# Altium footprint library ref-packages.PCBLIB: 1544 footprints (part 103 of 103)
Each footprint in its own frame and in the unit in brackets; x right, y up, seen from the top. Pads: shape width x height; smd on the part's side, far side on the other; paste and mask are expansions set on the pad; w line width, h text height; cw(c..) or ccw(c..) is an arc to the next point about the centre after c.
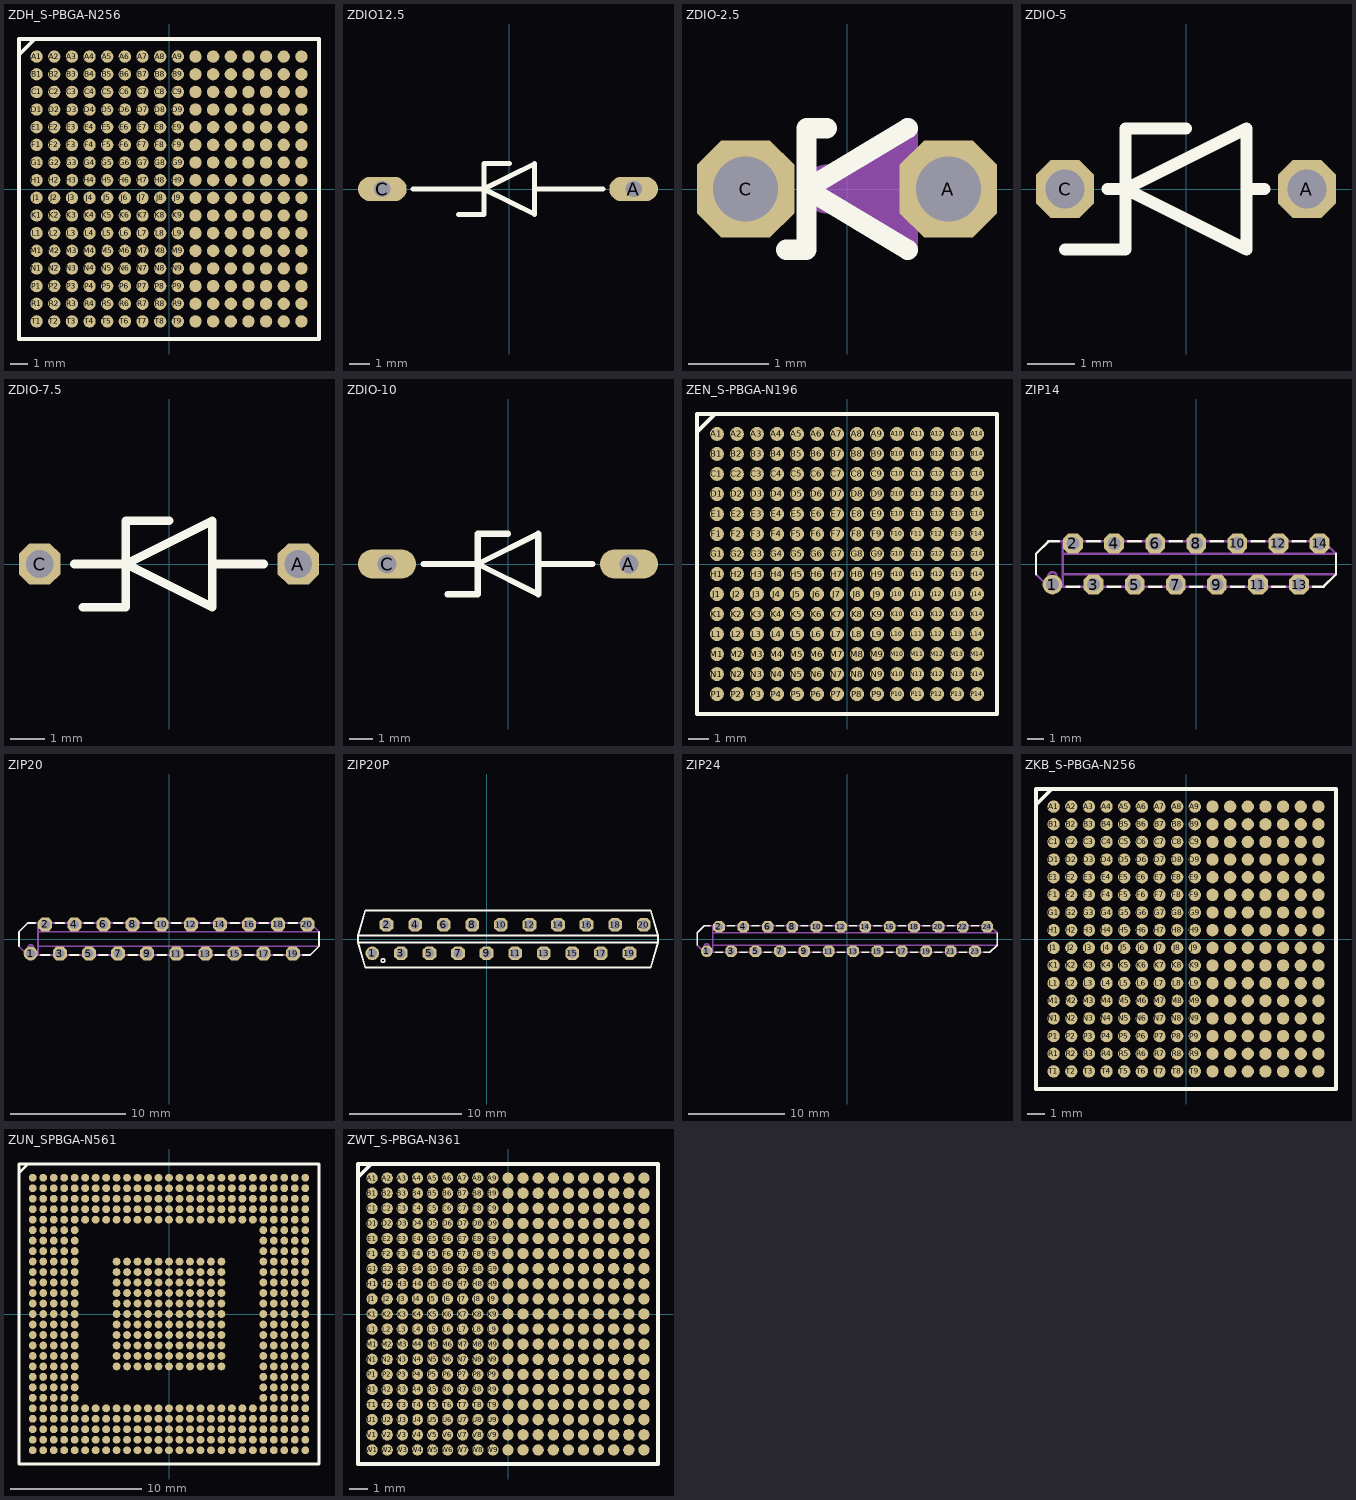
[diagram p102: the footprints below, top view; thin cyan lines are the x and y axes]

## ZDH_S-PBGA-N256 [mil]
pads (256):
  rrect100% 27.56x27.56 smd: A1(-295.28,295.28) A2(-255.91,295.28) A3(-216.54,295.28) A4(-177.17,295.28) A5(-137.8,295.28) A6(-98.43,295.28) A7(-59.06,295.28) A8(-19.69,295.28) A9(19.69,295.28) A10(59.06,295.28) A11(98.43,295.28) A12(137.8,295.28) A13(177.17,295.28) A14(216.54,295.28) A15(255.91,295.28) A16(295.28,295.28) B1(-295.28,255.91) B2(-255.91,255.91) B3(-216.54,255.91) B4(-177.17,255.91) B5(-137.8,255.91) B6(-98.43,255.91) B7(-59.06,255.91) B8(-19.69,255.91) B9(19.69,255.91) B10(59.06,255.91) B11(98.43,255.91) B12(137.8,255.91) B13(177.17,255.91) B14(216.54,255.91) B15(255.91,255.91) B16(295.28,255.91) C1(-295.28,216.54) C2(-255.91,216.54) C3(-216.54,216.54) C4(-177.17,216.54) C5(-137.8,216.54) C6(-98.43,216.54) C7(-59.06,216.54) C8(-19.69,216.54) C9(19.69,216.54) C10(59.06,216.54) C11(98.43,216.54) C12(137.8,216.54) C13(177.17,216.54) C14(216.54,216.54) C15(255.91,216.54) C16(295.28,216.54) D1(-295.28,177.17) D2(-255.91,177.17) D3(-216.54,177.17) D4(-177.17,177.17) D5(-137.8,177.17) D6(-98.43,177.17) D7(-59.06,177.17) D8(-19.69,177.17) D9(19.69,177.17) D10(59.06,177.17) D11(98.43,177.17) D12(137.8,177.17) D13(177.17,177.17) D14(216.54,177.17) D15(255.91,177.17) D16(295.28,177.17) E1(-295.28,137.8) E2(-255.91,137.8) E3(-216.54,137.8) E4(-177.17,137.8) E5(-137.8,137.8) E6(-98.43,137.8) E7(-59.06,137.8) E8(-19.69,137.8) E9(19.69,137.8) E10(59.06,137.8) E11(98.43,137.8) E12(137.8,137.8) E13(177.17,137.8) E14(216.54,137.8) E15(255.91,137.8) E16(295.28,137.8) F1(-295.28,98.43) F2(-255.91,98.43) F3(-216.54,98.43) F4(-177.17,98.43) F5(-137.8,98.43) F6(-98.43,98.43) F7(-59.06,98.43) F8(-19.69,98.43) F9(19.69,98.43) F10(59.06,98.43) F11(98.43,98.43) F12(137.8,98.43) F13(177.17,98.43) F14(216.54,98.43) F15(255.91,98.43) F16(295.28,98.43) G1(-295.28,59.06) G2(-255.91,59.06) G3(-216.54,59.06) G4(-177.17,59.06) G5(-137.8,59.06) G6(-98.43,59.06) G7(-59.06,59.06) G8(-19.69,59.06) G9(19.69,59.06) G10(59.06,59.06) G11(98.43,59.06) G12(137.8,59.06) G13(177.17,59.06) G14(216.54,59.06) G15(255.91,59.06) G16(295.28,59.06) H1(-295.28,19.69) H2(-255.91,19.69) H3(-216.54,19.69) H4(-177.17,19.69) H5(-137.8,19.69) H6(-98.43,19.69) H7(-59.06,19.69) H8(-19.69,19.69) H9(19.69,19.69) H10(59.06,19.69) H11(98.43,19.69) H12(137.8,19.69) H13(177.17,19.69) H14(216.54,19.69) H15(255.91,19.69) H16(295.28,19.69) J1(-295.28,-19.69) J2(-255.91,-19.69) J3(-216.54,-19.69) J4(-177.17,-19.69) J5(-137.8,-19.69) J6(-98.43,-19.69) J7(-59.06,-19.69) J8(-19.69,-19.69) J9(19.69,-19.69) J10(59.06,-19.69) J11(98.43,-19.69) J12(137.8,-19.69) J13(177.17,-19.69) J14(216.54,-19.69) J15(255.91,-19.69) J16(295.28,-19.69) K1(-295.28,-59.06) K2(-255.91,-59.06) K3(-216.54,-59.06) K4(-177.17,-59.06) K5(-137.8,-59.06) K6(-98.43,-59.06) K7(-59.06,-59.06) K8(-19.69,-59.06) K9(19.69,-59.06) K10(59.06,-59.06) K11(98.43,-59.06) K12(137.8,-59.06) K13(177.17,-59.06) K14(216.54,-59.06) K15(255.91,-59.06) K16(295.28,-59.06) L1(-295.28,-98.43) L2(-255.91,-98.43) L3(-216.54,-98.43) L4(-177.17,-98.43) L5(-137.8,-98.43) L6(-98.43,-98.43) L7(-59.06,-98.43) L8(-19.69,-98.43) L9(19.69,-98.43) L10(59.06,-98.43) L11(98.43,-98.43) L12(137.8,-98.43) L13(177.17,-98.43) L14(216.54,-98.43) L15(255.91,-98.43) L16(295.28,-98.43) M1(-295.28,-137.8) M2(-255.91,-137.8) M3(-216.54,-137.8) M4(-177.17,-137.8) M5(-137.8,-137.8) M6(-98.43,-137.8) M7(-59.06,-137.8) M8(-19.69,-137.8) M9(19.69,-137.8) M10(59.06,-137.8) M11(98.43,-137.8) M12(137.8,-137.8) M13(177.17,-137.8) M14(216.54,-137.8) M15(255.91,-137.8) M16(295.28,-137.8) N1(-295.28,-177.17) N2(-255.91,-177.17) N3(-216.54,-177.17) N4(-177.17,-177.17) N5(-137.8,-177.17) N6(-98.43,-177.17) N7(-59.06,-177.17) N8(-19.69,-177.17) N9(19.69,-177.17) N10(59.06,-177.17) N11(98.43,-177.17) N12(137.8,-177.17) N13(177.17,-177.17) N14(216.54,-177.17) N15(255.91,-177.17) N16(295.28,-177.17) P1(-295.28,-216.54) P2(-255.91,-216.54) P3(-216.54,-216.54) P4(-177.17,-216.54) P5(-137.8,-216.54) P6(-98.43,-216.54) P7(-59.06,-216.54) P8(-19.69,-216.54) P9(19.69,-216.54) P10(59.06,-216.54) P11(98.43,-216.54) P12(137.8,-216.54) P13(177.17,-216.54) P14(216.54,-216.54) P15(255.91,-216.54) P16(295.28,-216.54) R1(-295.28,-255.91) R2(-255.91,-255.91) R3(-216.54,-255.91) R4(-177.17,-255.91) R5(-137.8,-255.91) R6(-98.43,-255.91) R7(-59.06,-255.91) R8(-19.69,-255.91) R9(19.69,-255.91) R10(59.06,-255.91) R11(98.43,-255.91) R12(137.8,-255.91) R13(177.17,-255.91) R14(216.54,-255.91) R15(255.91,-255.91) R16(295.28,-255.91) T1(-295.28,-295.28) T2(-255.91,-295.28) T3(-216.54,-295.28) T4(-177.17,-295.28) T5(-137.8,-295.28) T6(-98.43,-295.28) T7(-59.06,-295.28) T8(-19.69,-295.28) T9(19.69,-295.28) T10(59.06,-295.28) T11(98.43,-295.28) T12(137.8,-295.28) T13(177.17,-295.28) T14(216.54,-295.28) T15(255.91,-295.28) T16(295.28,-295.28)
Top Overlay:
  lines w8: -334.58,299.21 -334.58,334.58 -299.21,334.58 ; -334.58,299.21 -334.58,-334.58 334.58,-334.58 334.58,334.58 -299.21,334.58 ; -334.58,299.21 -299.21,334.58
Top Solder:
  drawing of 256 lines, arcs and shapes, not listed

## ZDIO12.5 [mil]
pads (2):
  oval 96x48 hole 32: A(245,0) C(-250,0)
Top Overlay:
  lines w10: -190,0 -50,0 ; -100,-50 -50,-50 -50,0 ; 0,50 -50,50 -50,0 ; 185,0 50,0 ; -50,0 50,50 50,0 ; -50,0 50,-50 50,0

## ZDIO-2.5 [mil]
pads (2):
  oct 48x48 hole 32: A(50,0) C(-50,0)
Top Overlay:
  lines w10: -30,-30 -20,-30 -20,0 ; -10,30 -20,30 -20,0 ; 30,-30 -20,0 ; 30,30 -20,0
Mechanical 16:
  lines w10: 30,-30 30,30
  lines w24: -10,0 20,0 ; 20,-10 20,0 ; 20,10 20,0

## ZDIO-5 [mil]
pads (2):
  oct 48x48 hole 32: A(100,0) C(-100,0)
Top Overlay:
  lines w10: -100,-50 -50,-50 -50,0 ; -65,0 -50,0 ; 0,50 -50,50 -50,0 ; 65,0 50,0 ; -50,0 50,50 50,0 ; -50,0 50,-50 50,0

## ZDIO-7.5 [mil]
pads (2):
  oct 48x48 hole 32: A(150,0) C(-150,0)
Top Overlay:
  lines w10: -110,0 -50,0 ; -100,-50 -50,-50 -50,0 ; 0,50 -50,50 -50,0 ; 110,0 50,0 ; -50,0 50,50 50,0 ; -50,0 50,-50 50,0

## ZDIO-10 [mil]
pads (2):
  oval 96x48 hole 32: A(200,0) C(-200,0)
Top Overlay:
  lines w10: -140,0 -50,0 ; -100,-50 -50,-50 -50,0 ; 0,50 -50,50 -50,0 ; 140,0 50,0 ; -50,0 50,50 50,0 ; -50,0 50,-50 50,0

## ZEN_S-PBGA-N196 [mil]
pads (196):
  rrect100% 27.56x27.56 smd: A1(-255.91,255.91) A2(-216.54,255.91) A3(-177.17,255.91) A4(-137.8,255.91) A5(-98.43,255.91) A6(-59.06,255.91) A7(-19.69,255.91) A8(19.69,255.91) A9(59.06,255.91) A10(98.43,255.91) A11(137.8,255.91) A12(177.17,255.91) A13(216.54,255.91) A14(255.91,255.91) B1(-255.91,216.54) B2(-216.54,216.54) B3(-177.17,216.54) B4(-137.8,216.54) B5(-98.43,216.54) B6(-59.06,216.54) B7(-19.69,216.54) B8(19.69,216.54) B9(59.06,216.54) B10(98.43,216.54) B11(137.8,216.54) B12(177.17,216.54) B13(216.54,216.54) B14(255.91,216.54) C1(-255.91,177.17) C2(-216.54,177.17) C3(-177.17,177.17) C4(-137.8,177.17) C5(-98.43,177.17) C6(-59.06,177.17) C7(-19.69,177.17) C8(19.69,177.17) C9(59.06,177.17) C10(98.43,177.17) C11(137.8,177.17) C12(177.17,177.17) C13(216.54,177.17) C14(255.91,177.17) D1(-255.91,137.8) D2(-216.54,137.8) D3(-177.17,137.8) D4(-137.8,137.8) D5(-98.43,137.8) D6(-59.06,137.8) D7(-19.69,137.8) D8(19.69,137.8) D9(59.06,137.8) D10(98.43,137.8) D11(137.8,137.8) D12(177.17,137.8) D13(216.54,137.8) D14(255.91,137.8) E1(-255.91,98.43) E2(-216.54,98.43) E3(-177.17,98.43) E4(-137.8,98.43) E5(-98.43,98.43) E6(-59.06,98.43) E7(-19.69,98.43) E8(19.69,98.43) E9(59.06,98.43) E10(98.43,98.43) E11(137.8,98.43) E12(177.17,98.43) E13(216.54,98.43) E14(255.91,98.43) F1(-255.91,59.06) F2(-216.54,59.06) F3(-177.17,59.06) F4(-137.8,59.06) F5(-98.43,59.06) F6(-59.06,59.06) F7(-19.69,59.06) F8(19.69,59.06) F9(59.06,59.06) F10(98.43,59.06) F11(137.8,59.06) F12(177.17,59.06) F13(216.54,59.06) F14(255.91,59.06) G1(-255.91,19.69) G2(-216.54,19.69) G3(-177.17,19.69) G4(-137.8,19.69) G5(-98.43,19.69) G6(-59.06,19.69) G7(-19.69,19.69) G8(19.69,19.69) G9(59.06,19.69) G10(98.43,19.69) G11(137.8,19.69) G12(177.17,19.69) G13(216.54,19.69) G14(255.91,19.69) H1(-255.91,-19.69) H2(-216.54,-19.69) H3(-177.17,-19.69) H4(-137.8,-19.69) H5(-98.43,-19.69) H6(-59.06,-19.69) H7(-19.69,-19.69) H8(19.69,-19.69) H9(59.06,-19.69) H10(98.43,-19.69) H11(137.8,-19.69) H12(177.17,-19.69) H13(216.54,-19.69) H14(255.91,-19.69) J1(-255.91,-59.06) J2(-216.54,-59.06) J3(-177.17,-59.06) J4(-137.8,-59.06) J5(-98.43,-59.06) J6(-59.06,-59.06) J7(-19.69,-59.06) J8(19.69,-59.06) J9(59.06,-59.06) J10(98.43,-59.06) J11(137.8,-59.06) J12(177.17,-59.06) J13(216.54,-59.06) J14(255.91,-59.06) K1(-255.91,-98.43) K2(-216.54,-98.43) K3(-177.17,-98.43) K4(-137.8,-98.43) K5(-98.43,-98.43) K6(-59.06,-98.43) K7(-19.69,-98.43) K8(19.69,-98.43) K9(59.06,-98.43) K10(98.43,-98.43) K11(137.8,-98.43) K12(177.17,-98.43) K13(216.54,-98.43) K14(255.91,-98.43) L1(-255.91,-137.8) L2(-216.54,-137.8) L3(-177.17,-137.8) L4(-137.8,-137.8) L5(-98.43,-137.8) L6(-59.06,-137.8) L7(-19.69,-137.8) L8(19.69,-137.8) L9(59.06,-137.8) L10(98.43,-137.8) L11(137.8,-137.8) L12(177.17,-137.8) L13(216.54,-137.8) L14(255.91,-137.8) M1(-255.91,-177.17) M2(-216.54,-177.17) M3(-177.17,-177.17) M4(-137.8,-177.17) M5(-98.43,-177.17) M6(-59.06,-177.17) M7(-19.69,-177.17) M8(19.69,-177.17) M9(59.06,-177.17) M10(98.43,-177.17) M11(137.8,-177.17) M12(177.17,-177.17) M13(216.54,-177.17) M14(255.91,-177.17) N1(-255.91,-216.54) N2(-216.54,-216.54) N3(-177.17,-216.54) N4(-137.8,-216.54) N5(-98.43,-216.54) N6(-59.06,-216.54) N7(-19.69,-216.54) N8(19.69,-216.54) N9(59.06,-216.54) N10(98.43,-216.54) N11(137.8,-216.54) N12(177.17,-216.54) N13(216.54,-216.54) N14(255.91,-216.54) P1(-255.91,-255.91) P2(-216.54,-255.91) P3(-177.17,-255.91) P4(-137.8,-255.91) P5(-98.43,-255.91) P6(-59.06,-255.91) P7(-19.69,-255.91) P8(19.69,-255.91) P9(59.06,-255.91) P10(98.43,-255.91) P11(137.8,-255.91) P12(177.17,-255.91) P13(216.54,-255.91) P14(255.91,-255.91)
Top Overlay:
  lines w8: -295.21,259.84 -295.21,295.21 -259.84,295.21 ; -295.21,259.84 -295.21,-295.21 295.21,-295.21 295.21,295.21 -259.84,295.21 ; -295.21,259.84 -259.84,295.21
Top Solder:
  drawing of 196 lines, arcs and shapes, not listed

## ZIP14 [mil]
pads (14):
  round 48 hole 32: 1(-350,-50)
  oct 48x48 hole 32: 2(-300,50) 3(-250,-50) 4(-200,50) 5(-150,-50) 6(-100,50) 7(-50,-50) 8(0,50) 9(50,-50) 10(100,50) 11(150,-50) 12(200,50) 13(250,-50) 14(300,50)
Top Overlay:
  lines w6: -390,-25 -390,25 -360,55 -335,55 ; -315,-55 -285,-55 ; -265,55 -235,55 ; -215,-55 -185,-55 ; -165,55 -135,55 ; -115,-55 -85,-55 ; -65,55 -35,55 ; -15,-55 15,-55 ; 35,55 65,55 ; 85,-55 115,-55 ; 135,55 165,55 ; 185,-55 215,-55 ; 235,55 265,55 ; 285,-55 310,-55 340,-25 340,25
Mechanical 16:
  circle w6: c-350,-30 r10
  lines w6: -390,-25 -360,-55 -325,-55 ; -335,55 -325,55 ; -315,-55 -325,-55 ; -285,-55 -215,-55 ; -265,55 -325,55 ; -235,55 -165,55 ; -185,-55 -115,-55 ; -135,55 -65,55 ; -85,-55 -15,-55 ; -35,55 35,55 ; 15,-55 85,-55 ; 65,55 135,55 ; 115,-55 185,-55 ; 165,55 235,55 ; 215,-55 285,-55 ; 265,55 310,55 340,25 -325,25 ; 340,-25 -325,-25 ; -325,-55 -325,-25 ; -325,-25 -325,25 ; -325,25 -325,55

## ZIP20 [mil]
pads (20):
  round 48 hole 32: 1(-475,-50)
  oct 48x48 hole 32: 2(-425,50) 3(-375,-50) 4(-325,50) 5(-275,-50) 6(-225,50) 7(-175,-50) 8(-125,50) 9(-75,-50) 10(-25,50) 11(25,-50) 12(75,50) 13(125,-50) 14(175,50) 15(225,-50) 16(275,50) 17(325,-50) 18(375,50) 19(425,-50) 20(475,50)
Top Overlay:
  lines w6: -515,-25 -515,25 -485,55 -460,55 ; -440,-55 -410,-55 ; -390,55 -360,55 ; -340,-55 -310,-55 ; -290,55 -260,55 ; -240,-55 -210,-55 ; -190,55 -160,55 ; -140,-55 -110,-55 ; -90,55 -60,55 ; -40,-55 -10,-55 ; 10,55 40,55 ; 60,-55 90,-55 ; 110,55 140,55 ; 160,-55 190,-55 ; 210,55 240,55 ; 260,-55 290,-55 ; 310,55 340,55 ; 360,-55 390,-55 ; 410,55 440,55 ; 460,-55 485,-55 515,-25 515,25
Mechanical 16:
  circle w6: c-475,-30 r10
  lines w6: -515,-25 -485,-55 -450,-55 ; -460,55 -450,55 ; -440,-55 -450,-55 ; -410,-55 -340,-55 ; -390,55 -450,55 ; -360,55 -290,55 ; -310,-55 -240,-55 ; -260,55 -190,55 ; -210,-55 -140,-55 ; -160,55 -90,55 ; -110,-55 -40,-55 ; -60,55 10,55 ; -10,-55 60,-55 ; 40,55 110,55 ; 90,-55 160,-55 ; 140,55 210,55 ; 190,-55 260,-55 ; 240,55 310,55 ; 290,-55 360,-55 ; 340,55 410,55 ; 390,-55 460,-55 ; 440,55 485,55 515,25 -450,25 ; 515,-25 -450,-25 ; -450,-55 -450,-25 ; -450,-25 -450,25 ; -450,25 -450,55

## ZIP20P [mil]
pads (20):
  round 48 hole 32: 1(-400,-50)
  oct 48x48 hole 32: 2(-350,50) 3(-300,-50) 4(-250,50) 5(-200,-50) 6(-150,50) 7(-100,-50) 8(-50,50) 9(0,-50) 10(50,50) 11(100,-50) 12(150,50) 13(200,-50) 14(250,50) 15(300,-50) 16(350,50) 17(400,-50) 18(450,50) 19(500,-50) 20(550,50)
Top Overlay:
  circle w6: c-362.5,-75 r6.25
  lines w6: 600,0 600,12.5 ; -450,-12.5 -425,-100 575,-100 600,-12.5 ; -450,-12.5 -450,12.5 ; -450,-12.5 600,-12.5 ; -450,12.5 -425,100 575,100 600,12.5 ; -450,12.5 600,12.5 ; 600,-12.5 600,12.5

## ZIP24 [mil]
pads (24):
  round 48 hole 32: 1(-575,-50)
  oct 48x48 hole 32: 2(-525,50) 3(-475,-50) 4(-425,50) 5(-375,-50) 6(-325,50) 7(-275,-50) 8(-225,50) 9(-175,-50) 10(-125,50) 11(-75,-50) 12(-25,50) 13(25,-50) 14(75,50) 15(125,-50) 16(175,50) 17(225,-50) 18(275,50) 19(325,-50) 20(375,50) 21(425,-50) 22(475,50) 23(525,-50) 24(575,50)
Top Overlay:
  lines w6: -615,-25 -615,25 -585,55 -560,55 ; -540,-55 -510,-55 ; -490,55 -460,55 ; -440,-55 -410,-55 ; -390,55 -360,55 ; -340,-55 -310,-55 ; -290,55 -260,55 ; -240,-55 -210,-55 ; -190,55 -160,55 ; -140,-55 -110,-55 ; -90,55 -60,55 ; -40,-55 -10,-55 ; 10,55 40,55 ; 60,-55 90,-55 ; 110,55 140,55 ; 160,-55 190,-55 ; 210,55 240,55 ; 260,-55 290,-55 ; 310,55 340,55 ; 360,-55 390,-55 ; 410,55 440,55 ; 460,-55 490,-55 ; 510,55 540,55 ; 560,-55 585,-55 615,-25 615,25
Mechanical 16:
  circle w6: c-575,-30 r10
  lines w6: -615,-25 -585,-55 -550,-55 ; -560,55 -550,55 ; -540,-55 -550,-55 ; -510,-55 -440,-55 ; -490,55 -550,55 ; -460,55 -390,55 ; -410,-55 -340,-55 ; -360,55 -290,55 ; -310,-55 -240,-55 ; -260,55 -190,55 ; -210,-55 -140,-55 ; -160,55 -90,55 ; -110,-55 -40,-55 ; -60,55 10,55 ; -10,-55 60,-55 ; 40,55 110,55 ; 90,-55 160,-55 ; 140,55 210,55 ; 190,-55 260,-55 ; 240,55 310,55 ; 290,-55 360,-55 ; 340,55 410,55 ; 390,-55 460,-55 ; 440,55 510,55 ; 490,-55 560,-55 ; 540,55 585,55 615,25 -550,25 ; 615,-25 -550,-25 ; -550,-55 -550,-25 ; -550,-25 -550,25 ; -550,25 -550,55

## ZKB_S-PBGA-N256 [mil]
pads (256):
  rrect100% 27.56x27.56 smd: A1(-295.28,295.28) A2(-255.91,295.28) A3(-216.54,295.28) A4(-177.17,295.28) A5(-137.8,295.28) A6(-98.43,295.28) A7(-59.06,295.28) A8(-19.69,295.28) A9(19.69,295.28) A10(59.06,295.28) A11(98.43,295.28) A12(137.8,295.28) A13(177.17,295.28) A14(216.54,295.28) A15(255.91,295.28) A16(295.28,295.28) B1(-295.28,255.91) B2(-255.91,255.91) B3(-216.54,255.91) B4(-177.17,255.91) B5(-137.8,255.91) B6(-98.43,255.91) B7(-59.06,255.91) B8(-19.69,255.91) B9(19.69,255.91) B10(59.06,255.91) B11(98.43,255.91) B12(137.8,255.91) B13(177.17,255.91) B14(216.54,255.91) B15(255.91,255.91) B16(295.28,255.91) C1(-295.28,216.54) C2(-255.91,216.54) C3(-216.54,216.54) C4(-177.17,216.54) C5(-137.8,216.54) C6(-98.43,216.54) C7(-59.06,216.54) C8(-19.69,216.54) C9(19.69,216.54) C10(59.06,216.54) C11(98.43,216.54) C12(137.8,216.54) C13(177.17,216.54) C14(216.54,216.54) C15(255.91,216.54) C16(295.28,216.54) D1(-295.28,177.17) D2(-255.91,177.17) D3(-216.54,177.17) D4(-177.17,177.17) D5(-137.8,177.17) D6(-98.43,177.17) D7(-59.06,177.17) D8(-19.69,177.17) D9(19.69,177.17) D10(59.06,177.17) D11(98.43,177.17) D12(137.8,177.17) D13(177.17,177.17) D14(216.54,177.17) D15(255.91,177.17) D16(295.28,177.17) E1(-295.28,137.8) E2(-255.91,137.8) E3(-216.54,137.8) E4(-177.17,137.8) E5(-137.8,137.8) E6(-98.43,137.8) E7(-59.06,137.8) E8(-19.69,137.8) E9(19.69,137.8) E10(59.06,137.8) E11(98.43,137.8) E12(137.8,137.8) E13(177.17,137.8) E14(216.54,137.8) E15(255.91,137.8) E16(295.28,137.8) F1(-295.28,98.43) F2(-255.91,98.43) F3(-216.54,98.43) F4(-177.17,98.43) F5(-137.8,98.43) F6(-98.43,98.43) F7(-59.06,98.43) F8(-19.69,98.43) F9(19.69,98.43) F10(59.06,98.43) F11(98.43,98.43) F12(137.8,98.43) F13(177.17,98.43) F14(216.54,98.43) F15(255.91,98.43) F16(295.28,98.43) G1(-295.28,59.06) G2(-255.91,59.06) G3(-216.54,59.06) G4(-177.17,59.06) G5(-137.8,59.06) G6(-98.43,59.06) G7(-59.06,59.06) G8(-19.69,59.06) G9(19.69,59.06) G10(59.06,59.06) G11(98.43,59.06) G12(137.8,59.06) G13(177.17,59.06) G14(216.54,59.06) G15(255.91,59.06) G16(295.28,59.06) H1(-295.28,19.69) H2(-255.91,19.69) H3(-216.54,19.69) H4(-177.17,19.69) H5(-137.8,19.69) H6(-98.43,19.69) H7(-59.06,19.69) H8(-19.69,19.69) H9(19.69,19.69) H10(59.06,19.69) H11(98.43,19.69) H12(137.8,19.69) H13(177.17,19.69) H14(216.54,19.69) H15(255.91,19.69) H16(295.28,19.69) J1(-295.28,-19.69) J2(-255.91,-19.69) J3(-216.54,-19.69) J4(-177.17,-19.69) J5(-137.8,-19.69) J6(-98.43,-19.69) J7(-59.06,-19.69) J8(-19.69,-19.69) J9(19.69,-19.69) J10(59.06,-19.69) J11(98.43,-19.69) J12(137.8,-19.69) J13(177.17,-19.69) J14(216.54,-19.69) J15(255.91,-19.69) J16(295.28,-19.69) K1(-295.28,-59.06) K2(-255.91,-59.06) K3(-216.54,-59.06) K4(-177.17,-59.06) K5(-137.8,-59.06) K6(-98.43,-59.06) K7(-59.06,-59.06) K8(-19.69,-59.06) K9(19.69,-59.06) K10(59.06,-59.06) K11(98.43,-59.06) K12(137.8,-59.06) K13(177.17,-59.06) K14(216.54,-59.06) K15(255.91,-59.06) K16(295.28,-59.06) L1(-295.28,-98.43) L2(-255.91,-98.43) L3(-216.54,-98.43) L4(-177.17,-98.43) L5(-137.8,-98.43) L6(-98.43,-98.43) L7(-59.06,-98.43) L8(-19.69,-98.43) L9(19.69,-98.43) L10(59.06,-98.43) L11(98.43,-98.43) L12(137.8,-98.43) L13(177.17,-98.43) L14(216.54,-98.43) L15(255.91,-98.43) L16(295.28,-98.43) M1(-295.28,-137.8) M2(-255.91,-137.8) M3(-216.54,-137.8) M4(-177.17,-137.8) M5(-137.8,-137.8) M6(-98.43,-137.8) M7(-59.06,-137.8) M8(-19.69,-137.8) M9(19.69,-137.8) M10(59.06,-137.8) M11(98.43,-137.8) M12(137.8,-137.8) M13(177.17,-137.8) M14(216.54,-137.8) M15(255.91,-137.8) M16(295.28,-137.8) N1(-295.28,-177.17) N2(-255.91,-177.17) N3(-216.54,-177.17) N4(-177.17,-177.17) N5(-137.8,-177.17) N6(-98.43,-177.17) N7(-59.06,-177.17) N8(-19.69,-177.17) N9(19.69,-177.17) N10(59.06,-177.17) N11(98.43,-177.17) N12(137.8,-177.17) N13(177.17,-177.17) N14(216.54,-177.17) N15(255.91,-177.17) N16(295.28,-177.17) P1(-295.28,-216.54) P2(-255.91,-216.54) P3(-216.54,-216.54) P4(-177.17,-216.54) P5(-137.8,-216.54) P6(-98.43,-216.54) P7(-59.06,-216.54) P8(-19.69,-216.54) P9(19.69,-216.54) P10(59.06,-216.54) P11(98.43,-216.54) P12(137.8,-216.54) P13(177.17,-216.54) P14(216.54,-216.54) P15(255.91,-216.54) P16(295.28,-216.54) R1(-295.28,-255.91) R2(-255.91,-255.91) R3(-216.54,-255.91) R4(-177.17,-255.91) R5(-137.8,-255.91) R6(-98.43,-255.91) R7(-59.06,-255.91) R8(-19.69,-255.91) R9(19.69,-255.91) R10(59.06,-255.91) R11(98.43,-255.91) R12(137.8,-255.91) R13(177.17,-255.91) R14(216.54,-255.91) R15(255.91,-255.91) R16(295.28,-255.91) T1(-295.28,-295.28) T2(-255.91,-295.28) T3(-216.54,-295.28) T4(-177.17,-295.28) T5(-137.8,-295.28) T6(-98.43,-295.28) T7(-59.06,-295.28) T8(-19.69,-295.28) T9(19.69,-295.28) T10(59.06,-295.28) T11(98.43,-295.28) T12(137.8,-295.28) T13(177.17,-295.28) T14(216.54,-295.28) T15(255.91,-295.28) T16(295.28,-295.28)
Top Overlay:
  lines w8: -334.58,299.21 -334.58,334.58 -299.21,334.58 ; -334.58,299.21 -334.58,-334.58 334.58,-334.58 334.58,334.58 -299.21,334.58 ; -334.58,299.21 -299.21,334.58
Top Solder:
  drawing of 256 lines, arcs and shapes, not listed

## ZUN_SPBGA-N561 [mm]
pads (561):
  rrect100% 0.6x0.6 smd: A1(-10.4,10.4) A2(-9.6,10.4) A3(-8.8,10.4) A4(-8,10.4) A5(-7.2,10.4) A6(-6.4,10.4) A7(-5.6,10.4) A8(-4.8,10.4) A9(-4,10.4) A10(-3.2,10.4) A11(-2.4,10.4) A12(-1.6,10.4) A13(-0.8,10.4) A14(0,10.4) A15(0.8,10.4) A16(1.6,10.4) A17(2.4,10.4) A18(3.2,10.4) A19(4,10.4) A20(4.8,10.4) A21(5.6,10.4) A22(6.4,10.4) A23(7.2,10.4) A24(8,10.4) A25(8.8,10.4) A26(9.6,10.4) A27(10.4,10.4) AA1(-10.4,-5.6) AA2(-9.6,-5.6) AA3(-8.8,-5.6) AA4(-8,-5.6) AA5(-7.2,-5.6) AA23(7.2,-5.6) AA24(8,-5.6) AA25(8.8,-5.6) AA26(9.6,-5.6) AA27(10.4,-5.6) AB1(-10.4,-6.4) AB2(-9.6,-6.4) AB3(-8.8,-6.4) AB4(-8,-6.4) AB5(-7.2,-6.4) AB23(7.2,-6.4) AB24(8,-6.4) AB25(8.8,-6.4) AB26(9.6,-6.4) AB27(10.4,-6.4) AC1(-10.4,-7.2) AC2(-9.6,-7.2) AC3(-8.8,-7.2) AC4(-8,-7.2) AC5(-7.2,-7.2) AC6(-6.4,-7.2) AC7(-5.6,-7.2) AC8(-4.8,-7.2) AC9(-4,-7.2) AC10(-3.2,-7.2) AC11(-2.4,-7.2) AC12(-1.6,-7.2) AC13(-0.8,-7.2) AC14(0,-7.2) AC15(0.8,-7.2) AC16(1.6,-7.2) AC17(2.4,-7.2) AC18(3.2,-7.2) AC19(4,-7.2) AC20(4.8,-7.2) AC21(5.6,-7.2) AC22(6.4,-7.2) AC23(7.2,-7.2) AC24(8,-7.2) AC25(8.8,-7.2) AC26(9.6,-7.2) AC27(10.4,-7.2) AD1(-10.4,-8) AD2(-9.6,-8) AD3(-8.8,-8) AD4(-8,-8) AD5(-7.2,-8) AD6(-6.4,-8) AD7(-5.6,-8) AD8(-4.8,-8) AD9(-4,-8) AD10(-3.2,-8) AD11(-2.4,-8) AD12(-1.6,-8) AD13(-0.8,-8) AD14(0,-8) AD15(0.8,-8) AD16(1.6,-8) AD17(2.4,-8) AD18(3.2,-8) AD19(4,-8) AD20(4.8,-8) AD21(5.6,-8) AD22(6.4,-8) AD23(7.2,-8) AD24(8,-8) AD25(8.8,-8) AD26(9.6,-8) AD27(10.4,-8) AE1(-10.4,-8.8) AE2(-9.6,-8.8) AE3(-8.8,-8.8) AE4(-8,-8.8) AE5(-7.2,-8.8) AE6(-6.4,-8.8) AE7(-5.6,-8.8) AE8(-4.8,-8.8) AE9(-4,-8.8) AE10(-3.2,-8.8) AE11(-2.4,-8.8) AE12(-1.6,-8.8) AE13(-0.8,-8.8) AE14(0,-8.8) AE15(0.8,-8.8) AE16(1.6,-8.8) AE17(2.4,-8.8) AE18(3.2,-8.8) AE19(4,-8.8) AE20(4.8,-8.8) AE21(5.6,-8.8) AE22(6.4,-8.8) AE23(7.2,-8.8) AE24(8,-8.8) AE25(8.8,-8.8) AE26(9.6,-8.8) AE27(10.4,-8.8) AF1(-10.4,-9.6) AF2(-9.6,-9.6) AF3(-8.8,-9.6) AF4(-8,-9.6) AF5(-7.2,-9.6) AF6(-6.4,-9.6) AF7(-5.6,-9.6) AF8(-4.8,-9.6) AF9(-4,-9.6) AF10(-3.2,-9.6) AF11(-2.4,-9.6) AF12(-1.6,-9.6) AF13(-0.8,-9.6) AF14(0,-9.6) AF15(0.8,-9.6) AF16(1.6,-9.6) AF17(2.4,-9.6) AF18(3.2,-9.6) AF19(4,-9.6) AF20(4.8,-9.6) AF21(5.6,-9.6) AF22(6.4,-9.6) AF23(7.2,-9.6) AF24(8,-9.6) AF25(8.8,-9.6) AF26(9.6,-9.6) AF27(10.4,-9.6) AG1(-10.4,-10.4) AG2(-9.6,-10.4) AG3(-8.8,-10.4) AG4(-8,-10.4) AG5(-7.2,-10.4) AG6(-6.4,-10.4) AG7(-5.6,-10.4) AG8(-4.8,-10.4) AG9(-4,-10.4) AG10(-3.2,-10.4) AG11(-2.4,-10.4) AG12(-1.6,-10.4) AG13(-0.8,-10.4) AG14(0,-10.4) AG15(0.8,-10.4) AG16(1.6,-10.4) AG17(2.4,-10.4) AG18(3.2,-10.4) AG19(4,-10.4) AG20(4.8,-10.4) AG21(5.6,-10.4) AG22(6.4,-10.4) AG23(7.2,-10.4) AG24(8,-10.4) AG25(8.8,-10.4) AG26(9.6,-10.4) AG27(10.4,-10.4) B1(-10.4,9.6) B2(-9.6,9.6) B3(-8.8,9.6) B4(-8,9.6) B5(-7.2,9.6) B6(-6.4,9.6) B7(-5.6,9.6) B8(-4.8,9.6) B9(-4,9.6) B10(-3.2,9.6) B11(-2.4,9.6) B12(-1.6,9.6) B13(-0.8,9.6) B14(0,9.6) B15(0.8,9.6) B16(1.6,9.6) B17(2.4,9.6) B18(3.2,9.6) B19(4,9.6) B20(4.8,9.6) B21(5.6,9.6) B22(6.4,9.6) B23(7.2,9.6) B24(8,9.6) B25(8.8,9.6) B26(9.6,9.6) B27(10.4,9.6) C1(-10.4,8.8) C2(-9.6,8.8) C3(-8.8,8.8) C4(-8,8.8) C5(-7.2,8.8) C6(-6.4,8.8) C7(-5.6,8.8) C8(-4.8,8.8) C9(-4,8.8) C10(-3.2,8.8) C11(-2.4,8.8) C12(-1.6,8.8) C13(-0.8,8.8) C14(0,8.8) C15(0.8,8.8) C16(1.6,8.8) C17(2.4,8.8) C18(3.2,8.8) C19(4,8.8) C20(4.8,8.8) C21(5.6,8.8) C22(6.4,8.8) C23(7.2,8.8) C24(8,8.8) C25(8.8,8.8) C26(9.6,8.8) C27(10.4,8.8) D1(-10.4,8) D2(-9.6,8) D3(-8.8,8) D4(-8,8) D5(-7.2,8) D6(-6.4,8) D7(-5.6,8) D8(-4.8,8) D9(-4,8) D10(-3.2,8) D11(-2.4,8) D12(-1.6,8) D13(-0.8,8) D14(0,8) D15(0.8,8) D16(1.6,8) D17(2.4,8) D18(3.2,8) D19(4,8) D20(4.8,8) D21(5.6,8) D22(6.4,8) D23(7.2,8) D24(8,8) D25(8.8,8) D26(9.6,8) D27(10.4,8) E1(-10.4,7.2) E2(-9.6,7.2) E3(-8.8,7.2) E4(-8,7.2) E5(-7.2,7.2) E6(-6.4,7.2) E7(-5.6,7.2) E8(-4.8,7.2) E9(-4,7.2) E10(-3.2,7.2) E11(-2.4,7.2) E12(-1.6,7.2) E13(-0.8,7.2) E14(0,7.2) E15(0.8,7.2) E16(1.6,7.2) E17(2.4,7.2) E18(3.2,7.2) E19(4,7.2) E20(4.8,7.2) E21(5.6,7.2) E22(6.4,7.2) E23(7.2,7.2) E24(8,7.2) E25(8.8,7.2) E26(9.6,7.2) E27(10.4,7.2) F1(-10.4,6.4) F2(-9.6,6.4) F3(-8.8,6.4) F4(-8,6.4) F5(-7.2,6.4) F23(7.2,6.4) F24(8,6.4) F25(8.8,6.4) F26(9.6,6.4) F27(10.4,6.4) G1(-10.4,5.6) G2(-9.6,5.6) G3(-8.8,5.6) G4(-8,5.6) G5(-7.2,5.6) G23(7.2,5.6) G24(8,5.6) G25(8.8,5.6) G26(9.6,5.6) G27(10.4,5.6) H1(-10.4,4.8) H2(-9.6,4.8) H3(-8.8,4.8) H4(-8,4.8) H5(-7.2,4.8) H23(7.2,4.8) H24(8,4.8) H25(8.8,4.8) H26(9.6,4.8) H27(10.4,4.8) J1(-10.4,4) J2(-9.6,4) J3(-8.8,4) J4(-8,4) J5(-7.2,4) J9(-4,4) J10(-3.2,4) J11(-2.4,4) J12(-1.6,4) J13(-0.8,4) J14(0,4) J15(0.8,4) J16(1.6,4) J17(2.4,4) J18(3.2,4) J19(4,4) J23(7.2,4) J24(8,4) J25(8.8,4) J26(9.6,4) J27(10.4,4) K1(-10.4,3.2) K2(-9.6,3.2) K3(-8.8,3.2) K4(-8,3.2) K5(-7.2,3.2) K9(-4,3.2) K10(-3.2,3.2) K11(-2.4,3.2) K12(-1.6,3.2) K13(-0.8,3.2) K14(0,3.2) K15(0.8,3.2) K16(1.6,3.2) K17(2.4,3.2) K18(3.2,3.2) K19(4,3.2) K23(7.2,3.2) K24(8,3.2) K25(8.8,3.2) K26(9.6,3.2) K27(10.4,3.2) L1(-10.4,2.4) L2(-9.6,2.4) L3(-8.8,2.4) L4(-8,2.4) L5(-7.2,2.4) L9(-4,2.4) L10(-3.2,2.4) L11(-2.4,2.4) L12(-1.6,2.4) L13(-0.8,2.4) L14(0,2.4) L15(0.8,2.4) L16(1.6,2.4) L17(2.4,2.4) L18(3.2,2.4) L19(4,2.4) L23(7.2,2.4) L24(8,2.4) L25(8.8,2.4) L26(9.6,2.4) L27(10.4,2.4) M1(-10.4,1.6) M2(-9.6,1.6) M3(-8.8,1.6) M4(-8,1.6) M5(-7.2,1.6) M9(-4,1.6) M10(-3.2,1.6) M11(-2.4,1.6) M12(-1.6,1.6) M13(-0.8,1.6) M14(0,1.6) M15(0.8,1.6) M16(1.6,1.6) M17(2.4,1.6) M18(3.2,1.6) M19(4,1.6) M23(7.2,1.6) M24(8,1.6) M25(8.8,1.6) M26(9.6,1.6) M27(10.4,1.6) N1(-10.4,0.8) N2(-9.6,0.8) N3(-8.8,0.8) N4(-8,0.8) N5(-7.2,0.8) N9(-4,0.8) N10(-3.2,0.8) N11(-2.4,0.8) N12(-1.6,0.8) N13(-0.8,0.8) N14(0,0.8) N15(0.8,0.8) N16(1.6,0.8) N17(2.4,0.8) N18(3.2,0.8) N19(4,0.8) N23(7.2,0.8) N24(8,0.8) N25(8.8,0.8) N26(9.6,0.8) N27(10.4,0.8) P1(-10.4,0) P2(-9.6,0) P3(-8.8,0) P4(-8,0) P5(-7.2,0) P9(-4,0) P10(-3.2,0) P11(-2.4,0) P12(-1.6,0) P13(-0.8,0) P14(0,0) P15(0.8,0) P16(1.6,0) P17(2.4,0) P18(3.2,0) P19(4,0) P23(7.2,0) P24(8,0) P25(8.8,0) P26(9.6,0) P27(10.4,0) R1(-10.4,-0.8) R2(-9.6,-0.8) R3(-8.8,-0.8) R4(-8,-0.8) R5(-7.2,-0.8) R9(-4,-0.8) R10(-3.2,-0.8) R11(-2.4,-0.8) R12(-1.6,-0.8) R13(-0.8,-0.8) R14(0,-0.8) R15(0.8,-0.8) R16(1.6,-0.8) R17(2.4,-0.8) R18(3.2,-0.8) R19(4,-0.8) R23(7.2,-0.8) R24(8,-0.8) R25(8.8,-0.8) R26(9.6,-0.8) R27(10.4,-0.8) T1(-10.4,-1.6) T2(-9.6,-1.6) T3(-8.8,-1.6) T4(-8,-1.6) T5(-7.2,-1.6) T9(-4,-1.6) T10(-3.2,-1.6) T11(-2.4,-1.6) T12(-1.6,-1.6) T13(-0.8,-1.6) T14(0,-1.6) T15(0.8,-1.6) T16(1.6,-1.6) T17(2.4,-1.6) T18(3.2,-1.6) T19(4,-1.6) T23(7.2,-1.6) T24(8,-1.6) T25(8.8,-1.6) T26(9.6,-1.6) T27(10.4,-1.6) U1(-10.4,-2.4) U2(-9.6,-2.4) U3(-8.8,-2.4) U4(-8,-2.4) U5(-7.2,-2.4) U9(-4,-2.4) U10(-3.2,-2.4) U11(-2.4,-2.4) U12(-1.6,-2.4) U13(-0.8,-2.4) U14(0,-2.4) U15(0.8,-2.4) U16(1.6,-2.4) U17(2.4,-2.4) U18(3.2,-2.4) U19(4,-2.4) U23(7.2,-2.4) U24(8,-2.4) U25(8.8,-2.4) U26(9.6,-2.4) U27(10.4,-2.4) V1(-10.4,-3.2) V2(-9.6,-3.2) V3(-8.8,-3.2) V4(-8,-3.2) V5(-7.2,-3.2) V9(-4,-3.2) V10(-3.2,-3.2) V11(-2.4,-3.2) V12(-1.6,-3.2) V13(-0.8,-3.2) V14(0,-3.2) V15(0.8,-3.2) V16(1.6,-3.2) V17(2.4,-3.2) V18(3.2,-3.2) V19(4,-3.2) V23(7.2,-3.2) V24(8,-3.2) V25(8.8,-3.2) V26(9.6,-3.2) V27(10.4,-3.2) W1(-10.4,-4) W2(-9.6,-4) W3(-8.8,-4) W4(-8,-4) W5(-7.2,-4) W9(-4,-4) W10(-3.2,-4) W11(-2.4,-4) W12(-1.6,-4) W13(-0.8,-4) W14(0,-4) W15(0.8,-4) W16(1.6,-4) W17(2.4,-4) W18(3.2,-4) W19(4,-4) W23(7.2,-4) W24(8,-4) W25(8.8,-4) W26(9.6,-4) W27(10.4,-4) Y1(-10.4,-4.8) Y2(-9.6,-4.8) Y3(-8.8,-4.8) Y4(-8,-4.8) Y5(-7.2,-4.8) Y23(7.2,-4.8) Y24(8,-4.8) Y25(8.8,-4.8) Y26(9.6,-4.8) Y27(10.4,-4.8)
Top Overlay:
  lines w0.203: -11.448,10.75 -11.448,11.448 -10.75,11.448 ; -11.448,10.75 -11.448,-11.448 11.448,-11.448 11.448,11.448 -10.75,11.448 ; -11.448,10.75 -10.75,11.448
Top Solder:
  drawing of 561 lines, arcs and shapes, not listed

## ZWT_S-PBGA-N361 [mil]
pads (361):
  rrect100% 23.62x23.62 smd: A1(-283.46,283.46) A2(-251.97,283.46) A3(-220.47,283.46) A4(-188.98,283.46) A5(-157.48,283.46) A6(-125.98,283.46) A7(-94.49,283.46) A8(-62.99,283.46) A9(-31.5,283.46) A10(0,283.46) A11(31.5,283.46) A12(62.99,283.46) A13(94.49,283.46) A14(125.98,283.46) A15(157.48,283.46) A16(188.98,283.46) A17(220.47,283.46) A18(251.97,283.46) A19(283.46,283.46) B1(-283.46,251.97) B2(-251.97,251.97) B3(-220.47,251.97) B4(-188.98,251.97) B5(-157.48,251.97) B6(-125.98,251.97) B7(-94.49,251.97) B8(-62.99,251.97) B9(-31.5,251.97) B10(0,251.97) B11(31.5,251.97) B12(62.99,251.97) B13(94.49,251.97) B14(125.98,251.97) B15(157.48,251.97) B16(188.98,251.97) B17(220.47,251.97) B18(251.97,251.97) B19(283.46,251.97) C1(-283.46,220.47) C2(-251.97,220.47) C3(-220.47,220.47) C4(-188.98,220.47) C5(-157.48,220.47) C6(-125.98,220.47) C7(-94.49,220.47) C8(-62.99,220.47) C9(-31.5,220.47) C10(0,220.47) C11(31.5,220.47) C12(62.99,220.47) C13(94.49,220.47) C14(125.98,220.47) C15(157.48,220.47) C16(188.98,220.47) C17(220.47,220.47) C18(251.97,220.47) C19(283.46,220.47) D1(-283.46,188.98) D2(-251.97,188.98) D3(-220.47,188.98) D4(-188.98,188.98) D5(-157.48,188.98) D6(-125.98,188.98) D7(-94.49,188.98) D8(-62.99,188.98) D9(-31.5,188.98) D10(0,188.98) D11(31.5,188.98) D12(62.99,188.98) D13(94.49,188.98) D14(125.98,188.98) D15(157.48,188.98) D16(188.98,188.98) D17(220.47,188.98) D18(251.97,188.98) D19(283.46,188.98) E1(-283.46,157.48) E2(-251.97,157.48) E3(-220.47,157.48) E4(-188.98,157.48) E5(-157.48,157.48) E6(-125.98,157.48) E7(-94.49,157.48) E8(-62.99,157.48) E9(-31.5,157.48) E10(0,157.48) E11(31.5,157.48) E12(62.99,157.48) E13(94.49,157.48) E14(125.98,157.48) E15(157.48,157.48) E16(188.98,157.48) E17(220.47,157.48) E18(251.97,157.48) E19(283.46,157.48) F1(-283.46,125.98) F2(-251.97,125.98) F3(-220.47,125.98) F4(-188.98,125.98) F5(-157.48,125.98) F6(-125.98,125.98) F7(-94.49,125.98) F8(-62.99,125.98) F9(-31.5,125.98) F10(0,125.98) F11(31.5,125.98) F12(62.99,125.98) F13(94.49,125.98) F14(125.98,125.98) F15(157.48,125.98) F16(188.98,125.98) F17(220.47,125.98) F18(251.97,125.98) F19(283.46,125.98) G1(-283.46,94.49) G2(-251.97,94.49) G3(-220.47,94.49) G4(-188.98,94.49) G5(-157.48,94.49) G6(-125.98,94.49) G7(-94.49,94.49) G8(-62.99,94.49) G9(-31.5,94.49) G10(0,94.49) G11(31.5,94.49) G12(62.99,94.49) G13(94.49,94.49) G14(125.98,94.49) G15(157.48,94.49) G16(188.98,94.49) G17(220.47,94.49) G18(251.97,94.49) G19(283.46,94.49) H1(-283.46,62.99) H2(-251.97,62.99) H3(-220.47,62.99) H4(-188.98,62.99) H5(-157.48,62.99) H6(-125.98,62.99) H7(-94.49,62.99) H8(-62.99,62.99) H9(-31.5,62.99) H10(0,62.99) H11(31.5,62.99) H12(62.99,62.99) H13(94.49,62.99) H14(125.98,62.99) H15(157.48,62.99) H16(188.98,62.99) H17(220.47,62.99) H18(251.97,62.99) H19(283.46,62.99) J1(-283.46,31.5) J2(-251.97,31.5) J3(-220.47,31.5) J4(-188.98,31.5) J5(-157.48,31.5) J6(-125.98,31.5) J7(-94.49,31.5) J8(-62.99,31.5) J9(-31.5,31.5) J10(0,31.5) J11(31.5,31.5) J12(62.99,31.5) J13(94.49,31.5) J14(125.98,31.5) J15(157.48,31.5) J16(188.98,31.5) J17(220.47,31.5) J18(251.97,31.5) J19(283.46,31.5) K1(-283.46,0) K2(-251.97,0) K3(-220.47,0) K4(-188.98,0) K5(-157.48,0) K6(-125.98,0) K7(-94.49,0) K8(-62.99,0) K9(-31.5,0) K10(0,0) K11(31.5,0) K12(62.99,0) K13(94.49,0) K14(125.98,0) K15(157.48,0) K16(188.98,0) K17(220.47,0) K18(251.97,0) K19(283.46,0) L1(-283.46,-31.5) L2(-251.97,-31.5) L3(-220.47,-31.5) L4(-188.98,-31.5) L5(-157.48,-31.5) L6(-125.98,-31.5) L7(-94.49,-31.5) L8(-62.99,-31.5) L9(-31.5,-31.5) L10(0,-31.5) L11(31.5,-31.5) L12(62.99,-31.5) L13(94.49,-31.5) L14(125.98,-31.5) L15(157.48,-31.5) L16(188.98,-31.5) L17(220.47,-31.5) L18(251.97,-31.5) L19(283.46,-31.5) M1(-283.46,-62.99) M2(-251.97,-62.99) M3(-220.47,-62.99) M4(-188.98,-62.99) M5(-157.48,-62.99) M6(-125.98,-62.99) M7(-94.49,-62.99) M8(-62.99,-62.99) M9(-31.5,-62.99) M10(0,-62.99) M11(31.5,-62.99) M12(62.99,-62.99) M13(94.49,-62.99) M14(125.98,-62.99) M15(157.48,-62.99) M16(188.98,-62.99) M17(220.47,-62.99) M18(251.97,-62.99) M19(283.46,-62.99) N1(-283.46,-94.49) N2(-251.97,-94.49) N3(-220.47,-94.49) N4(-188.98,-94.49) N5(-157.48,-94.49) N6(-125.98,-94.49) N7(-94.49,-94.49) N8(-62.99,-94.49) N9(-31.5,-94.49) N10(0,-94.49) N11(31.5,-94.49) N12(62.99,-94.49) N13(94.49,-94.49) N14(125.98,-94.49) N15(157.48,-94.49) N16(188.98,-94.49) N17(220.47,-94.49) N18(251.97,-94.49) N19(283.46,-94.49) P1(-283.46,-125.98) P2(-251.97,-125.98) P3(-220.47,-125.98) P4(-188.98,-125.98) P5(-157.48,-125.98) P6(-125.98,-125.98) P7(-94.49,-125.98) P8(-62.99,-125.98) P9(-31.5,-125.98) P10(0,-125.98) P11(31.5,-125.98) P12(62.99,-125.98) P13(94.49,-125.98) P14(125.98,-125.98) P15(157.48,-125.98) P16(188.98,-125.98) P17(220.47,-125.98) P18(251.97,-125.98) P19(283.46,-125.98) R1(-283.46,-157.48) R2(-251.97,-157.48) R3(-220.47,-157.48) R4(-188.98,-157.48) R5(-157.48,-157.48) R6(-125.98,-157.48) R7(-94.49,-157.48) R8(-62.99,-157.48) R9(-31.5,-157.48) R10(0,-157.48) R11(31.5,-157.48) R12(62.99,-157.48) R13(94.49,-157.48) R14(125.98,-157.48) R15(157.48,-157.48) R16(188.98,-157.48) R17(220.47,-157.48) R18(251.97,-157.48) R19(283.46,-157.48) T1(-283.46,-188.98) T2(-251.97,-188.98) T3(-220.47,-188.98) T4(-188.98,-188.98) T5(-157.48,-188.98) T6(-125.98,-188.98) T7(-94.49,-188.98) T8(-62.99,-188.98) T9(-31.5,-188.98) T10(0,-188.98) T11(31.5,-188.98) T12(62.99,-188.98) T13(94.49,-188.98) T14(125.98,-188.98) T15(157.48,-188.98) T16(188.98,-188.98) T17(220.47,-188.98) T18(251.97,-188.98) T19(283.46,-188.98) U1(-283.46,-220.47) U2(-251.97,-220.47) U3(-220.47,-220.47) U4(-188.98,-220.47) U5(-157.48,-220.47) U6(-125.98,-220.47) U7(-94.49,-220.47) U8(-62.99,-220.47) U9(-31.5,-220.47) U10(0,-220.47) U11(31.5,-220.47) U12(62.99,-220.47) U13(94.49,-220.47) U14(125.98,-220.47) U15(157.48,-220.47) U16(188.98,-220.47) U17(220.47,-220.47) U18(251.97,-220.47) U19(283.46,-220.47) V1(-283.46,-251.97) V2(-251.97,-251.97) V3(-220.47,-251.97) V4(-188.98,-251.97) V5(-157.48,-251.97) V6(-125.98,-251.97) V7(-94.49,-251.97) V8(-62.99,-251.97) V9(-31.5,-251.97) V10(0,-251.97) V11(31.5,-251.97) V12(62.99,-251.97) V13(94.49,-251.97) V14(125.98,-251.97) V15(157.48,-251.97) V16(188.98,-251.97) V17(220.47,-251.97) V18(251.97,-251.97) V19(283.46,-251.97) W1(-283.46,-283.46) W2(-251.97,-283.46) W3(-220.47,-283.46) W4(-188.98,-283.46) W5(-157.48,-283.46) W6(-125.98,-283.46) W7(-94.49,-283.46) W8(-62.99,-283.46) W9(-31.5,-283.46) W10(0,-283.46) W11(31.5,-283.46) W12(62.99,-283.46) W13(94.49,-283.46) W14(125.98,-283.46) W15(157.48,-283.46) W16(188.98,-283.46) W17(220.47,-283.46) W18(251.97,-283.46) W19(283.46,-283.46)
Top Overlay:
  lines w8: -312.93,285.43 -312.93,312.93 -285.43,312.93 ; -312.93,285.43 -312.93,-312.93 312.93,-312.93 312.93,312.93 -285.43,312.93 ; -312.93,285.43 -285.43,312.93
Top Solder:
  drawing of 361 lines, arcs and shapes, not listed